# Altium footprint library Wurth_Elektronik_Electromechanic_Wire_to_Board_Connectors_rev16a.PCBLIB: 662 footprints (part 12 of 42)
Each footprint in its own frame and in the unit in brackets; x right, y up, seen from the top. Pads: shape width x height; smd on the part's side, far side on the other; paste and mask are expansions set on the pad; w line width, h text height; cw(c..) or ccw(c..) is an arc to the next point about the centre after c.
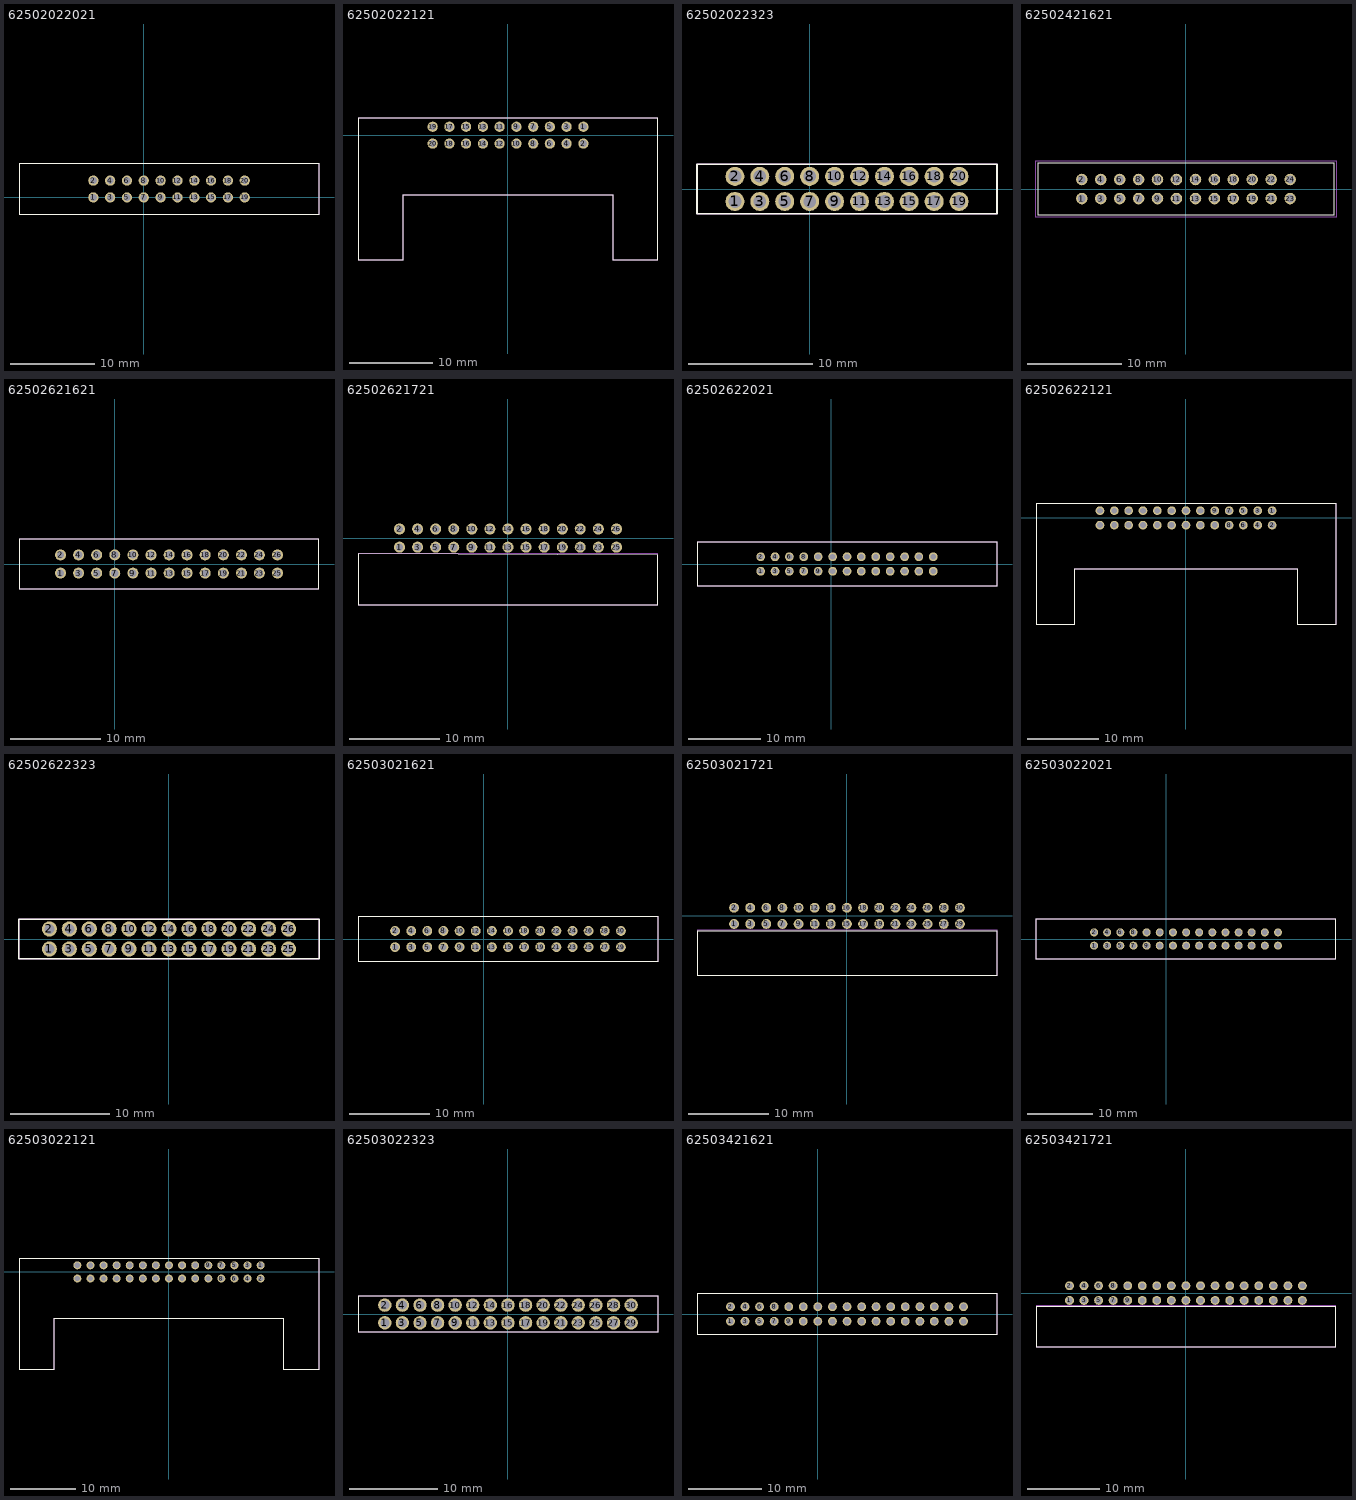
[diagram p11: the footprints below, top view; thin cyan lines are the x and y axes]

## 62502022021 [mil]
pads (20):
  round 48 hole 32: 1(-236.22,0) 2(-236.22,79) 3(-157.48,0) 4(-157.48,79) 5(-78.74,0) 6(-78.74,79) 7(0,0) 8(0,79) 9(79,0) 10(79,79) 11(158,0) 12(158,79) 13(237,0) 14(237,79) 15(315,0) 16(315,79) 17(394,0) 18(394,79) 19(473,0) 20(473,79)
Top Overlay:
  lines w5: -584.65,-78.74 821,-78.74 821,158 -584.65,158 -584.65,-78.74
Mechanical 2:
  text ">NAME" at 36,178 h77.5
Mechanical 4:
  text ">VALUE" at 11,-137.8 h77.5
Mechanical 16:
  lines w5: -584.65,-78.74 -584.65,158 821,158 821,-78.74 -584.65,-78.74
  text "1" at -255.91,-19.68 h77.5
  text "20" at 454,60 h77.5

## 62502022121 [mil]
pads (20):
  round 48 hole 32: 1(355,40) 2(355,-39.37) 3(276,40) 4(276,-39.37) 5(197,40) 6(197,-39.37) 7(119,40) 8(119,-39.37) 9(40,40) 10(40,-39.37) 11(-39.37,40) 12(-39.37,-39.37) 13(-118.11,40) 14(-118.11,-39.37) 15(-196.85,40) 16(-196.85,-39.37) 17(-275.59,40) 18(-275.59,-39.37) 19(-354.33,40) 20(-354.33,-39.37)
Top Overlay:
  lines w5: -705.71,-584.65 -492.13,-584.65 -492.13,-279.53 493,-279.53 493,-584.65 706,-584.65 706,79 -705.71,79 -705.71,-584.65
Mechanical 2:
  text ">NAME" at -1012.99,-242.32 h77.5
Mechanical 4:
  text ">VALUE" at -1024.8,-316.54 h77.5
Mechanical 16:
  lines w5: -705.71,-584.65 -705.71,79 706,79 706,-584.65 493,-584.65 493,-279.53 -492.13,-279.53 -492.13,-584.65 -705.71,-584.65
  text "1" at 338,16 h77.5
  text "20" at -401.57,-80.31 h77.5

## 62502022323 [mil]
pads (20):
  round 60 hole 40: 1(-236.22,-39.37) 2(-236.22,40) 3(-157.48,-39.37) 4(-157.48,40) 5(-78.74,-39.37) 6(-78.74,40) 7(0,-39.37) 8(0,40) 9(79,-39.37) 10(79,40) 11(158,-39.37) 12(158,40) 13(237,-39.37) 14(237,40) 15(315,-39.37) 16(315,40) 17(394,-39.37) 18(394,40) 19(473,-39.37) 20(473,40)
Top Overlay:
  lines w5: -356.3,-78.74 593,-78.74 593,79 -356.3,79 -356.3,-78.74
Mechanical 2:
  text ">NAME" at -14.96,113 h77.5
Mechanical 4:
  text ">VALUE" at -14.96,-152.17 h77.5
Mechanical 16:
  lines w5: -356.3,-78.74 -356.3,79 593,79 593,-78.74 -356.3,-78.74
  text "1" at -255.91,-59.06 h77.5
  text "20" at 470,16 h77.5

## 62502421621 [mil]
pads (24):
  round 48 hole 32: 1(-433.07,-39.37) 2(-433.07,40) 3(-354.33,-39.37) 4(-354.33,40) 5(-275.59,-39.37) 6(-275.59,40) 7(-196.85,-39.37) 8(-196.85,40) 9(-118.11,-39.37) 10(-118.11,40) 11(-39.37,-39.37) 12(-39.37,40) 13(40,-39.37) 14(40,40) 15(119,-39.37) 16(119,40) 17(197,-39.37) 18(197,40) 19(276,-39.37) 20(276,40) 21(355,-39.37) 22(355,40) 23(434,-39.37) 24(434,40)
Top Overlay:
  lines w5: -614.17,-108.27 -614.17,109 615,109 615,-108.27 -614.17,-108.27
Mechanical 2:
  text ">NAME" at -614.17,129 h77.5
Mechanical 4:
  text ">VALUE" at -614.17,-178.27 h77.5
Mechanical 27:
  lines w5: -624.02,-118.11 -624.02,119 625,119 625,-118.11 -624.02,-118.11

## 62502621621 [mil]
pads (26):
  round 48 hole 32: 1(-236.22,-39.37) 2(-236.22,40) 3(-157.48,-39.37) 4(-157.48,40) 5(-78.74,-39.37) 6(-78.74,40) 7(0,-39.37) 8(0,40) 9(79,-39.37) 10(79,40) 11(158,-39.37) 12(158,40) 13(237,-39.37) 14(237,40) 15(315,-39.37) 16(315,40) 17(394,-39.37) 18(394,40) 19(473,-39.37) 20(473,40) 21(552,-39.37) 22(552,40) 23(630,-39.37) 24(630,40) 25(709,-39.37) 26(709,40)
Top Overlay:
  lines w5: -417.32,-108.27 890,-108.27 890,109 -417.32,109 -417.32,-108.27
Mechanical 2:
  text ">NAME" at 186,138 h77.5
Mechanical 4:
  text ">VALUE" at 161,-177.17 h77.5
Mechanical 16:
  lines w5: -417.32,-108.27 -417.32,109 890,109 890,-108.27 -417.32,-108.27
  text "1" at -255.91,-59.06 h77.5
  text "26" at 679,20 h77.5

## 62502621721 [mil]
pads (26):
  round 48 hole 32: 1(-472.44,-39.37) 2(-472.44,40) 3(-393.7,-39.37) 4(-393.7,40) 5(-314.96,-39.37) 6(-314.96,40) 7(-236.22,-39.37) 8(-236.22,40) 9(-157.48,-39.37) 10(-157.48,40) 11(-78.74,-39.37) 12(-78.74,40) 13(0,-39.37) 14(0,40) 15(79,-39.37) 16(79,40) 17(158,-39.37) 18(158,40) 19(237,-39.37) 20(237,40) 21(315,-39.37) 22(315,40) 23(394,-39.37) 24(394,40) 25(473,-39.37) 26(473,40)
Top Overlay:
  lines w5: -653.54,-289.37 654,-289.37 654,-74.8 -653.54,-68.9 -653.54,-289.37
Mechanical 2:
  text ">NAME" at -907.48,-157.48 h77.5
Mechanical 4:
  text ">VALUE" at -932.48,-236.22 h77.5
Mechanical 16:
  lines w5: -653.54,-289.37 -653.54,-68.9 654,-68.9 654,-289.37 -653.54,-289.37
  text "1" at -492.13,-59.06 h77.5
  text "26" at 442,20 h77.5

## 62502622021 [mil]
pads (26):
  round 48 hole 32: 1(-386.22,-39.37) 2(-386.22,40) 3(-307.48,-39.37) 4(-307.48,40) 5(-228.74,-39.37) 6(-228.74,40) 7(-150,-39.37) 8(-150,40) 9(-71.26,-39.37) 10(-71.26,40) 11(8,-39.37) 12(8,40) 13(87,-39.37) 14(87,40) 15(165,-39.37) 16(165,40) 17(244,-39.37) 18(244,40) 19(323,-39.37) 20(323,40) 21(402,-39.37) 22(402,40) 23(480,-39.37) 24(480,40) 25(559,-39.37) 26(559,40)
Top Overlay:
  lines w5: -734.65,-118.11 908,-118.11 908,119 -734.65,119 -734.65,-118.11
Mechanical 2:
  text ">NAME" at 36,138 h77.5
Mechanical 4:
  text ">VALUE" at 11,-177.17 h77.5
Mechanical 16:
  lines w5: -734.65,-118.11 -734.65,119 908,119 908,-118.11 -734.65,-118.11
  text "1" at -405.91,-59.06 h77.5
  text "26" at 529,20 h77.5

## 62502622121 [mil]
pads (26):
  round 48 hole 32: 1(473,40) 2(473,-39.37) 3(394,40) 4(394,-39.37) 5(315,40) 6(315,-39.37) 7(237,40) 8(237,-39.37) 9(158,40) 10(158,-39.37) 11(79,40) 12(79,-39.37) 13(0,40) 14(0,-39.37) 15(-78.74,40) 16(-78.74,-39.37) 17(-157.48,40) 18(-157.48,-39.37) 19(-236.22,40) 20(-236.22,-39.37) 21(-314.96,40) 22(-314.96,-39.37) 23(-393.7,40) 24(-393.7,-39.37) 25(-472.44,40) 26(-472.44,-39.37)
Top Overlay:
  lines w5: -823.82,-584.65 -610.24,-584.65 -610.24,-279.53 611,-279.53 611,-584.65 824,-584.65 824,79 -823.82,79 -823.82,-584.65
Mechanical 2:
  text ">NAME" at -1087.99,-192.32 h77.5
Mechanical 4:
  text ">VALUE" at -1099.8,-266.54 h77.5
Mechanical 16:
  lines w5: -823.82,-584.65 -823.82,79 824,79 824,-584.65 611,-584.65 611,-279.53 -610.24,-279.53 -610.24,-584.65 -823.82,-584.65
  text "1" at 456,16 h77.5
  text "26" at -533.46,-55.31 h77.5

## 62502622323 [mil]
pads (26):
  round 60 hole 40: 1(-472.44,-39.37) 2(-472.44,40) 3(-393.7,-39.37) 4(-393.7,40) 5(-314.96,-39.37) 6(-314.96,40) 7(-236.22,-39.37) 8(-236.22,40) 9(-157.48,-39.37) 10(-157.48,40) 11(-78.74,-39.37) 12(-78.74,40) 13(0,-39.37) 14(0,40) 15(79,-39.37) 16(79,40) 17(158,-39.37) 18(158,40) 19(237,-39.37) 20(237,40) 21(315,-39.37) 22(315,40) 23(394,-39.37) 24(394,40) 25(473,-39.37) 26(473,40)
Top Overlay:
  lines w5: -592.52,-78.74 593,-78.74 593,79 -592.52,79 -592.52,-78.74
Mechanical 2:
  text ">NAME" at -126.18,113 h77.5
Mechanical 4:
  text ">VALUE" at -126.18,-152.17 h77.5
Mechanical 16:
  lines w5: -592.52,-78.74 -592.52,79 593,79 593,-78.74 -592.52,-78.74
  text "1" at -492.13,-59.06 h77.5
  text "26" at 442,20 h77.5

## 62503021621 [mil]
pads (30):
  round 48 hole 32: 1(-433.07,-39.37) 2(-433.07,40) 3(-354.33,-39.37) 4(-354.33,40) 5(-275.59,-39.37) 6(-275.59,40) 7(-196.85,-39.37) 8(-196.85,40) 9(-118.11,-39.37) 10(-118.11,40) 11(-39.37,-39.37) 12(-39.37,40) 13(40,-39.37) 14(40,40) 15(119,-39.37) 16(119,40) 17(197,-39.37) 18(197,40) 19(276,-39.37) 20(276,40) 21(355,-39.37) 22(355,40) 23(434,-39.37) 24(434,40) 25(512,-39.37) 26(512,40) 27(591,-39.37) 28(591,40) 29(670,-39.37) 30(670,40)
Top Overlay:
  lines w5: -614.17,-108.27 851,-108.27 851,109 -614.17,109 -614.17,-108.27
Mechanical 2:
  text ">NAME" at -11.81,138 h77.5
Mechanical 4:
  text ">VALUE" at -36.81,-177.17 h77.5
Mechanical 16:
  lines w5: -614.17,-108.27 -614.17,109 851,109 851,-108.27 -614.17,-108.27
  text "1" at -452.76,-59.06 h77.5
  text "30" at 657,20 h77.5

## 62503021721 [mil]
pads (30):
  round 48 hole 32: 1(-551.18,-39.37) 2(-551.18,40) 3(-472.44,-39.37) 4(-472.44,40) 5(-393.7,-39.37) 6(-393.7,40) 7(-314.96,-39.37) 8(-314.96,40) 9(-236.22,-39.37) 10(-236.22,40) 11(-157.48,-39.37) 12(-157.48,40) 13(-78.74,-39.37) 14(-78.74,40) 15(0,-39.37) 16(0,40) 17(79,-39.37) 18(79,40) 19(158,-39.37) 20(158,40) 21(237,-39.37) 22(237,40) 23(315,-39.37) 24(315,40) 25(394,-39.37) 26(394,40) 27(473,-39.37) 28(473,40) 29(552,-39.37) 30(552,40)
Top Overlay:
  lines w5: -732.28,-289.37 733,-289.37 733,-74.8 -732.28,-74.8 -732.28,-289.37
Mechanical 2:
  text ">NAME" at -995.87,-159.84 h77.5
Mechanical 4:
  text ">VALUE" at -1025.39,-224.8 h77.5
Mechanical 16:
  lines w5: -732.28,-289.37 -732.28,-68.9 733,-68.9 733,-289.37 -732.28,-289.37
  text "1" at -570.87,-59.06 h77.5
  text "30" at 539,20 h77.5

## 62503022021 [mil]
pads (30):
  round 48 hole 32: 1(-433.07,-39.37) 2(-433.07,40) 3(-354.33,-39.37) 4(-354.33,40) 5(-275.59,-39.37) 6(-275.59,40) 7(-196.85,-39.37) 8(-196.85,40) 9(-118.11,-39.37) 10(-118.11,40) 11(-39.37,-39.37) 12(-39.37,40) 13(40,-39.37) 14(40,40) 15(119,-39.37) 16(119,40) 17(197,-39.37) 18(197,40) 19(276,-39.37) 20(276,40) 21(355,-39.37) 22(355,40) 23(434,-39.37) 24(434,40) 25(512,-39.37) 26(512,40) 27(591,-39.37) 28(591,40) 29(670,-39.37) 30(670,40)
Top Overlay:
  lines w5: -781.5,-118.11 1018,-118.11 1018,119 -781.5,119 -781.5,-118.11
Mechanical 2:
  text ">NAME" at -11.81,138 h77.5
Mechanical 4:
  text ">VALUE" at -36.81,-177.17 h77.5
Mechanical 16:
  lines w5: -781.5,-118.11 -781.5,119 1018,119 1018,-118.11 -781.5,-118.11
  text "1" at -452.76,-59.06 h77.5
  text "30" at 657,20 h77.5

## 62503022121 [mil]
pads (30):
  round 48 hole 32: 1(552,40) 2(552,-39.37) 3(473,40) 4(473,-39.37) 5(394,40) 6(394,-39.37) 7(315,40) 8(315,-39.37) 9(237,40) 10(237,-39.37) 11(158,40) 12(158,-39.37) 13(79,40) 14(79,-39.37) 15(0,40) 16(0,-39.37) 17(-78.74,40) 18(-78.74,-39.37) 19(-157.48,40) 20(-157.48,-39.37) 21(-236.22,40) 22(-236.22,-39.37) 23(-314.96,40) 24(-314.96,-39.37) 25(-393.7,40) 26(-393.7,-39.37) 27(-472.44,40) 28(-472.44,-39.37) 29(-551.18,40) 30(-551.18,-39.37)
Top Overlay:
  lines w5: -902.56,-584.65 -688.98,-584.65 -688.98,-279.53 689,-279.53 689,-584.65 903,-584.65 903,79 -902.56,79 -902.56,-584.65
Mechanical 2:
  text ">NAME" at -1184.25,-217.32 h77.5
Mechanical 4:
  text ">VALUE" at -1196.06,-291.54 h77.5
Mechanical 16:
  lines w5: -902.56,-584.65 -902.56,79 903,79 903,-584.65 689,-584.65 689,-279.53 -688.98,-279.53 -688.98,-584.65 -902.56,-584.65
  text "1" at 535,16 h77.5
  text "30" at -604.72,-80.31 h77.5

## 62503022323 [mil]
pads (30):
  round 60 hole 40: 1(-551.18,-39.37) 2(-551.18,40) 3(-472.44,-39.37) 4(-472.44,40) 5(-393.7,-39.37) 6(-393.7,40) 7(-314.96,-39.37) 8(-314.96,40) 9(-236.22,-39.37) 10(-236.22,40) 11(-157.48,-39.37) 12(-157.48,40) 13(-78.74,-39.37) 14(-78.74,40) 15(0,-39.37) 16(0,40) 17(79,-39.37) 18(79,40) 19(158,-39.37) 20(158,40) 21(237,-39.37) 22(237,40) 23(315,-39.37) 24(315,40) 25(394,-39.37) 26(394,40) 27(473,-39.37) 28(473,40) 29(552,-39.37) 30(552,40)
Top Overlay:
  lines w5: -671.26,-78.74 672,-78.74 672,79 -671.26,79 -671.26,-78.74
Mechanical 2:
  text ">NAME" at -179.92,113 h77.5
Mechanical 4:
  text ">VALUE" at -179.92,-152.17 h77.5
Mechanical 16:
  lines w5: -671.26,-78.74 -671.26,79 672,79 672,-78.74 -671.26,-78.74
  text "1" at -570.87,-59.06 h77.5
  text "30" at 539,20 h77.5

## 62503421621 [mil]
pads (34):
  round 48 hole 32: 1(-472.44,-39.37) 2(-472.44,40) 3(-393.7,-39.37) 4(-393.7,40) 5(-314.96,-39.37) 6(-314.96,40) 7(-236.22,-39.37) 8(-236.22,40) 9(-157.48,-39.37) 10(-157.48,40) 11(-78.74,-39.37) 12(-78.74,40) 13(0,-39.37) 14(0,40) 15(79,-39.37) 16(79,40) 17(158,-39.37) 18(158,40) 19(237,-39.37) 20(237,40) 21(315,-39.37) 22(315,40) 23(394,-39.37) 24(394,40) 25(473,-39.37) 26(473,40) 27(552,-39.37) 28(552,40) 29(630,-39.37) 30(630,40) 31(709,-39.37) 32(709,40) 33(788,-39.37) 34(788,40)
Top Overlay:
  lines w5: -653.54,-108.27 969,-108.27 969,109 -653.54,109 -653.54,-108.27
Mechanical 2:
  text ">NAME" at 49,138 h77.5
Mechanical 4:
  text ">VALUE" at 49,-177.17 h77.5
Mechanical 16:
  lines w5: -653.54,-108.27 -653.54,109 969,109 969,-108.27 -653.54,-108.27
  text "1" at -492.13,-59.06 h77.5
  text "34" at 767,20 h77.5

## 62503421721 [mil]
pads (34):
  round 48 hole 32: 1(-629.92,-39.37) 2(-629.92,40) 3(-551.18,-39.37) 4(-551.18,40) 5(-472.44,-39.37) 6(-472.44,40) 7(-393.7,-39.37) 8(-393.7,40) 9(-314.96,-39.37) 10(-314.96,40) 11(-236.22,-39.37) 12(-236.22,40) 13(-157.48,-39.37) 14(-157.48,40) 15(-78.74,-39.37) 16(-78.74,40) 17(0,-39.37) 18(0,40) 19(79,-39.37) 20(79,40) 21(158,-39.37) 22(158,40) 23(237,-39.37) 24(237,40) 25(315,-39.37) 26(315,40) 27(394,-39.37) 28(394,40) 29(473,-39.37) 30(473,40) 31(552,-39.37) 32(552,40) 33(630,-39.37) 34(630,40)
Top Overlay:
  lines w5: -811.02,-289.37 812,-289.37 812,-74.8 -811.02,-74.8 -811.02,-289.37
Mechanical 2:
  text ">NAME" at -1083.07,-157.48 h77.5
Mechanical 4:
  text ">VALUE" at -1112.6,-236.22 h77.5
Mechanical 16:
  lines w5: -811.02,-289.37 -811.02,-68.9 812,-68.9 812,-289.37 -811.02,-289.37
  text "1" at -649.61,-59.06 h77.5
  text "34" at 610,20 h77.5